# Altium integrated library Mastermind Devices.IntLib: 910 symbols (part 5 of 6) (continued)
## SS12D00G3 (continued)
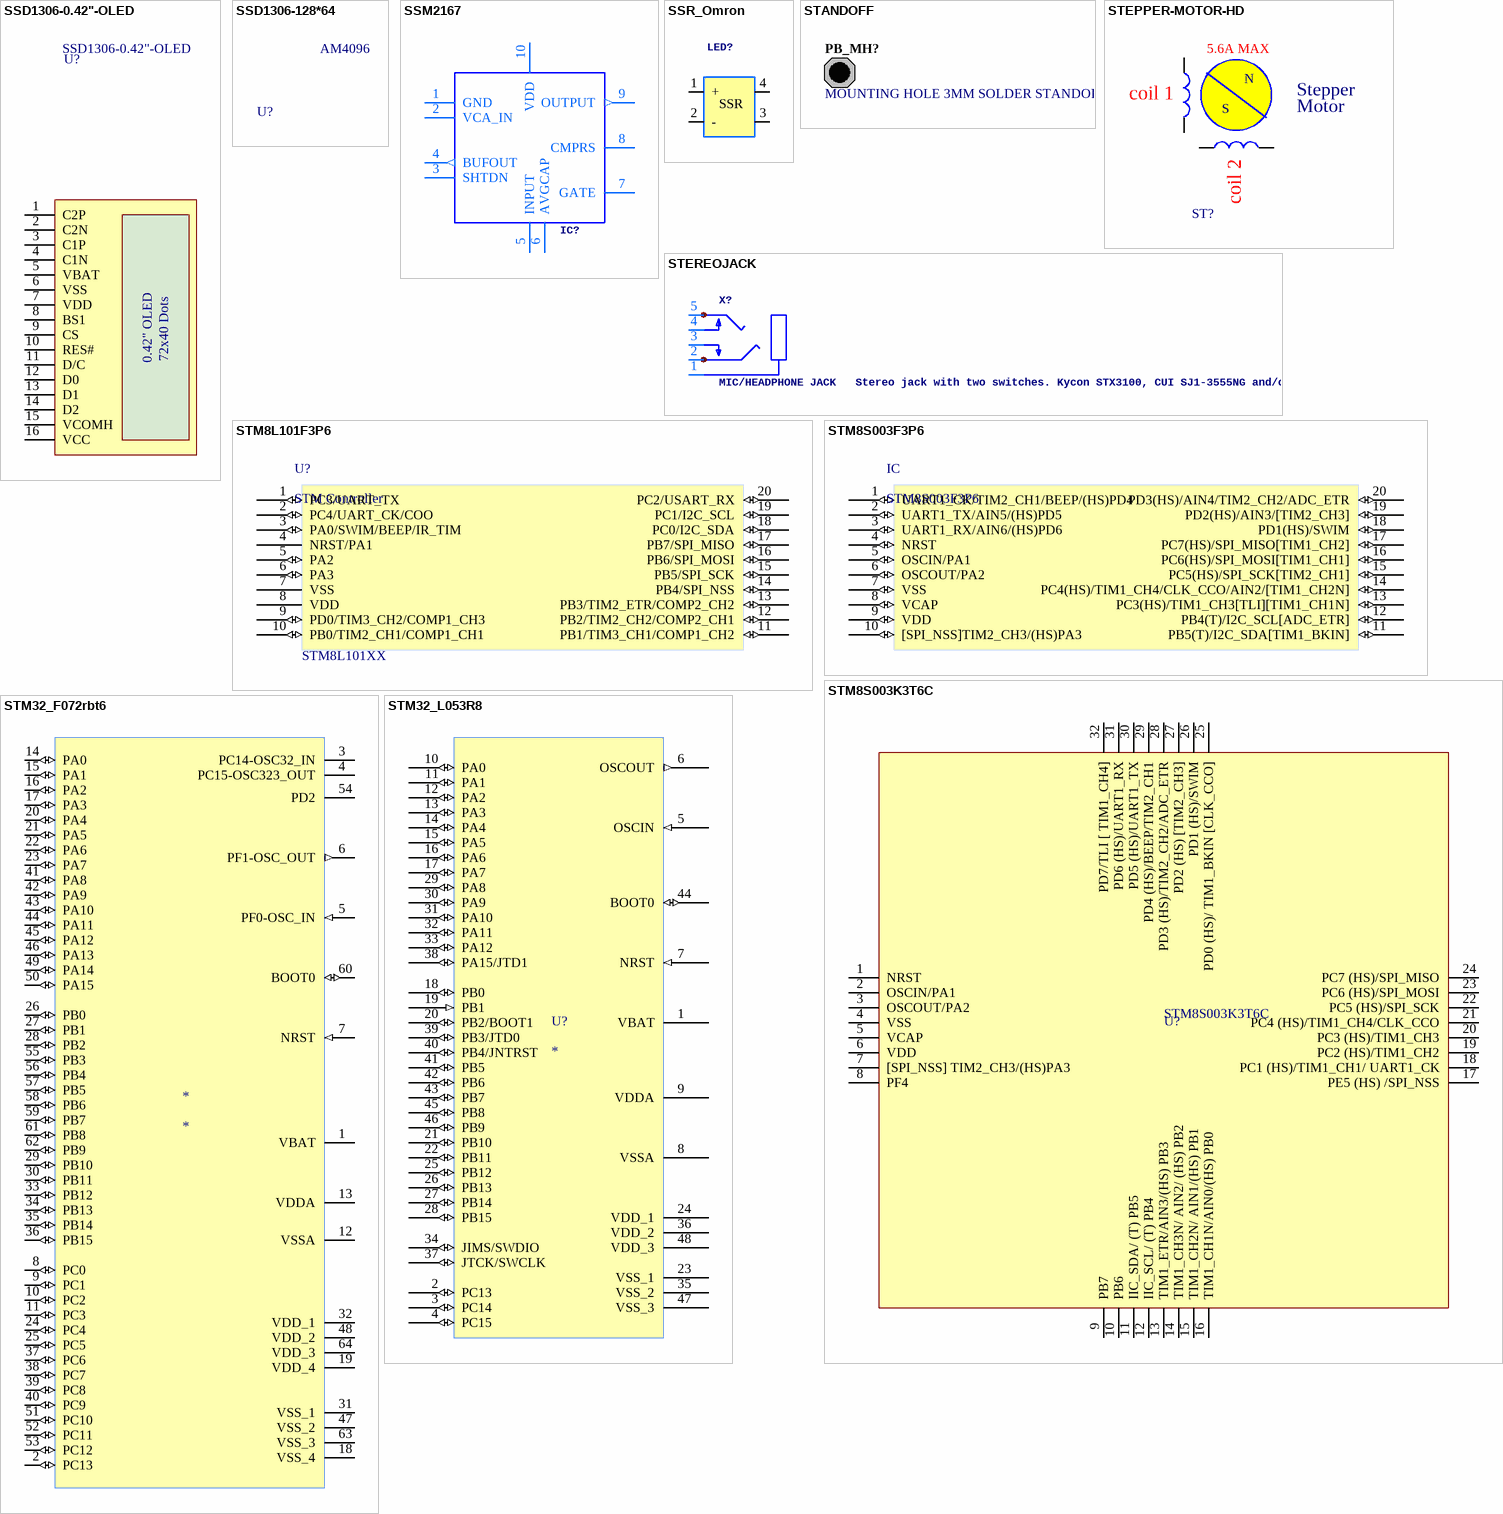
[diagram p31: symbols SSD1306-0.42"-OLED to STM32_L053R8]

## SSD1306-0.42"-OLED
designator U?
OLED Display ROHS; Manufacturer: Newvision(新智景); Symbol: N087-2832TSWYG02-H14; Add into BOM: yes; Device: N087-2832TSWYG02-H14; LCSC Part Name: 0.87寸 白光 128x32像素分辨率 14PIN; Supplier Part: C2890610; Manufacturer Part: N087-2832TSWYG02-H14; Supplier Footprint: -; JLCPCB Part Class: Extended Part; Datasheet: https://atta.szlcsc.com/upload/public/pdf/source/20220801/014279878C5155A8BB30742A627C84A8.pdf; Supplier: LCSC; Convert to PCB: yes
footprint OLED-SMD_0.42"
pins: 1 C2P, 2 C2N, 3 C1P, 4 C1N, 5 VBAT, 6 VSS, 7 VDD, 8 BS1, 9 CS, 10 RES#, 11 D/C, 12 D0, 13 D1, 14 D2, 15 VCOMH, 16 VCC
text: 0.42" OLED; 72x40 Dots

## SSD1306-128*64
designator U?, comment AM4096
OLED Display ROHS

## SSM2167
designator IC?, comment SSM2167   Microphone conditioner chip  (value not drawn)
footprint MSOP10
pins: 1 GND (power), 2 VCA_IN, 3 SHTDN, 4 BUFOUT (out), 5 INPUT, 6 AVGCAP, 7 GATE, 8 CMPRS, 9 OUTPUT (out), 10 VDD (power)

## SSR_Omron
designator LED?  (value not drawn)
footprint SSR_Omron
pins: 1 +, 2 -, 3, 4
text: SSR

## STANDOFF
designator PB_MH?, comment MOUNTING HOLE 3MM SOLDER STANDOFF  (no BOM)
Mounting Hole for Solder Standoff, M3 Screw, Plated, Round Pad; Category: Mounting-Hole; Status: Production
footprint STANDOFF_SOLDER_3MM
pins: 1 hidden

## STEPPER-MOTOR-HD
designator ST?
4PIN stepper Motor
footprint JST_B4B-XH-A(LF)(SN)
pins: 1, 2, 3, 4
text: 5.6A MAX; N; coil 1; Stepper; S; Motor; coil 2

## STEREOJACK
designator X?, comment MIC/HEADPHONE JACK   Stereo jack with two switches. Kycon STX3100, CUI SJ1-3555NG and/or 4UCon 05544
footprint STX3100
pins: 1, 2, 3, 4, 5

## STM8L101F3P6
designator U?, comment STM Controller
STM8 8-Bit 16MHz 8KB _8K x 8_ FLASH; MP: STM8S003F3P6; MF: STMicroelectronics; Availability: Unavailable; SnapEDA_Link: https://www.snapeda.com/parts/STM8S003F3P6/STMicroelectronics/view-part/47650/?ref=snap; Price: None; Value: *; Package: TSSOP-20 STMicroelectronics
footprint TSSOP20
pins: 1 PC3/UART_TX (io), 2 PC4/UART_CK/COO (io), 3 PA0/SWIM/BEEP/IR_TIM (io), 4 NRST/PA1 (oc), 5 PA2 (io), 6 PA3 (io), 7 VSS (power), 8 VDD (power), 9 PD0/TIM3_CH2/COMP1_CH3 (io), 10 PB0/TIM2_CH1/COMP1_CH1 (io), 11 PB1/TIM3_CH1/COMP1_CH2 (io), 12 PB2/TIM2_CH2/COMP2_CH1 (io), 13 PB3/TIM2_ETR/COMP2_CH2 (io), 14 PB4/SPI_NSS (io), 15 PB5/SPI_SCK (io), 16 PB6/SPI_MOSI (io), 17 PB7/SPI_MISO (io), 18 PC0/I2C_SDA (io), 19 PC1/I2C_SCL (io), 20 PC2/USART_RX (io)
text: STM8L101XX

## STM8S003F3P6
designator IC
STM8 8-Bit 16MHz 8KB _8K x 8_ FLASH; MF: STMicroelectronics; Availability: Unavailable; SnapEDA_Link: https://www.snapeda.com/parts/STM8S003F3P6/STMicroelectronics/view-part/47650/?ref=snap; MP: STM8S003F3P6; Price: None; Value: *; Package: TSSOP-20 STMicroelectronics
footprint TSSOP20
pins: 1 UART1_CK/TIM2_CH1/BEEP/(HS)PD4 (io), 2 UART1_TX/AIN5/(HS)PD5 (io), 3 UART1_RX/AIN6/(HS)PD6 (io), 4 NRST (io), 5 OSCIN/PA1 (io), 6 OSCOUT/PA2 (io), 7 VSS (io), 8 VCAP (io), 9 VDD (io), 10 [SPI_NSS]TIM2_CH3/(HS)PA3 (io), 11 PB5(T)/I2C_SDA[TIM1_BKIN] (io), 12 PB4(T)/I2C_SCL[ADC_ETR] (io), 13 PC3(HS)/TIM1_CH3[TLI][TIM1_CH1N] (io), 14 PC4(HS)/TIM1_CH4/CLK_CCO/AIN2/[TIM1_CH2N] (io), 15 PC5(HS)/SPI_SCK[TIM2_CH1] (io), 16 PC6(HS)/SPI_MOSI[TIM1_CH1] (io), 17 PC7(HS)/SPI_MISO[TIM1_CH2] (io), 18 PD1(HS)/SWIM (io), 19 PD2(HS)/AIN3/[TIM2_CH3] (io), 20 PD3(HS)/AIN4/TIM2_CH2/ADC_ETR (io)

## STM8S003K3T6C
designator U?
STM8 16MHz LQFP-32(7x7) Microcontrollers (MCU/MPU/SOC) ROHS; Manufacturer: ST(意法半导体); Add into BOM: yes; Program Storage Size: 8KB; RAM Size: 1KB; GPIO Ports Number: 28; Operating Voltage Range: 2.95V~5.5V; Program Memory Type: FLASH; ADC (Bit): 10bit; Peripheral/Function: Watchdog；PWM; Symbol: STM8S003K3T6C; Device: STM8S003K3T6C; LCSC Part Name: 主流超值系列8位MCU，具有8 KB Flash、16 MHz CPU和集成EEPROM; Supplier Part: C27142; Manufacturer Part: STM8S003K3T6C; Supplier Footprint: LQFP-32(7x7); JLCPCB Part Class: Extended Part; Datasheet: https://atta.szlcsc.com/upload/public/pdf/source/20140319/1457707024027.pdf; Supplier: LCSC; Convert to PCB: yes; CPU Core: STM8; CPU Maximum Speed: 16MHz; Operating Temperature Range: -40℃~+85℃; DAC (Bit): -; PWM (Bit): -; Universal Serial Bus: -; Internal Comparator: -; communication protocol: -; Watchdog: Yes; Real-Time Clock: -; Infrared Data Association: Yes; Low-Voltage Detect: Yes; CCP Capture/Compare: -; Secure Digital Input and Output: -; Direct Memory Access: -; Internal Oscillator: Yes
footprint LQFP-32_L7.0-W7.0-P0.80-LS9.0-BL
pins: 1 NRST, 2 OSCIN/PA1, 3 OSCOUT/PA2, 4 VSS, 5 VCAP, 6 VDD, 7 [SPI_NSS] TIM2_CH3/(HS)PA3, 8 PF4, 9 PB7, 10 PB6, 11 IIC_SDA/ (T) PB5, 12 IIC_SCL/ (T) PB4, 13 TIM1_ETR/AIN3/(HS) PB3, 14 TIM1_CH3N/ AIN2/ (HS) PB2, 15 TIM1_CH2N/ AIN1/(HS) PB1, 16 TIM1_CH1N/AIN0/(HS) PB0, 17 PE5 (HS) /SPI_NSS, 18 PC1 (HS)/TIM1_CH1/ UART1_CK, 19 PC2 (HS)/TIM1_CH2, 20 PC3 (HS)/TIM1_CH3, 21 PC4 (HS)/TIM1_CH4/CLK_CCO, 22 PC5 (HS)/SPI_SCK, 23 PC6 (HS)/SPI_MOSI, 24 PC7 (HS)/SPI_MISO, 25 PD0 (HS)/ TIM1_BKIN [CLK_CCO], 26 PD1 (HS)/SWIM, 27 PD2 (HS) [TIM2_CH3], 28 PD3 (HS)/TIM2_CH2/ADC_ETR, 29 PD4 (HS)/BEEP/TIM2_CH1, 30 PD5 (HS)/UART1_TX, 31 PD6 (HS)/UART1_RX, 32 PD7/TLI [ TIM1_CH4]

## STM32_F072rbt6
designator *
footprint TQFP64
pins: 1 VBAT, 2 PC13 (io), 3 PC14-OSC32_IN, 4 PC15-OSC323_OUT, 5 PF0-OSC_IN (in), 6 PF1-OSC_OUT (out), 7 NRST (in), 8 PC0 (io), 9 PC1 (io), 10 PC2 (io), 11 PC3 (io), 12 VSSA, 13 VDDA, 14 PA0 (io), 15 PA1 (io), 16 PA2 (io), 17 PA3 (io), 18 VSS_4, 19 VDD_4, 20 PA4 (io), 21 PA5 (io), 22 PA6 (io), 23 PA7 (io), 24 PC4 (io), 25 PC5 (io), 26 PB0 (io), 27 PB1 (io), 28 PB2 (io), 29 PB10 (io), 30 PB11 (io), 31 VSS_1, 32 VDD_1, 33 PB12 (io), 34 PB13 (io), 35 PB14 (io), 36 PB15 (io), 37 PC6 (io), 38 PC7 (io), 39 PC8 (io), 40 PC9 (io), 41 PA8 (io), 42 PA9 (io), 43 PA10 (io), 44 PA11 (io), 45 PA12 (io), 46 PA13 (io), 47 VSS_2, 48 VDD_2, 49 PA14 (io), 50 PA15 (io), 51 PC10 (io), 52 PC11 (io), 53 PC12 (io), 54 PD2, 55 PB3 (io), 56 PB4 (io), 57 PB5 (io), 58 PB6 (io), 59 PB7 (io), 60 BOOT0 (io), 61 PB8 (io), 62 PB9 (io), 63 VSS_3, 64 VDD_3

## STM32_L053R8
designator U?
48 pin STM32
footprint TQFP48
pins: 1 VBAT, 2 PC13 (io), 3 PC14 (io), 4 PC15 (io), 5 OSCIN (in), 6 OSCOUT (out), 7 NRST (in), 8 VSSA, 9 VDDA, 10 PA0 (io), 11 PA1 (io), 12 PA2 (io), 13 PA3 (io), 14 PA4 (io), 15 PA5 (io), 16 PA6 (io), 17 PA7 (io), 18 PB0 (io), 19 PB1 (in), 20 PB2/BOOT1 (io), 21 PB10 (io), 22 PB11 (io), 23 VSS_1, 24 VDD_1, 25 PB12 (io), 26 PB13 (io), 27 PB14 (io), 28 PB15 (io), 29 PA8 (io), 30 PA9 (io), 31 PA10 (io), 32 PA11 (io), 33 PA12 (io), 34 JIMS/SWDIO (io), 35 VSS_2, 36 VDD_2, 37 JTCK/SWCLK (io), 38 PA15/JTD1 (io), 39 PB3/JTD0 (io), 40 PB4/JNTRST (io), 41 PB5 (io), 42 PB6 (io), 43 PB7 (io), 44 BOOT0 (io), 45 PB8 (io), 46 PB9 (io), 47 VSS_3, 48 VDD_3

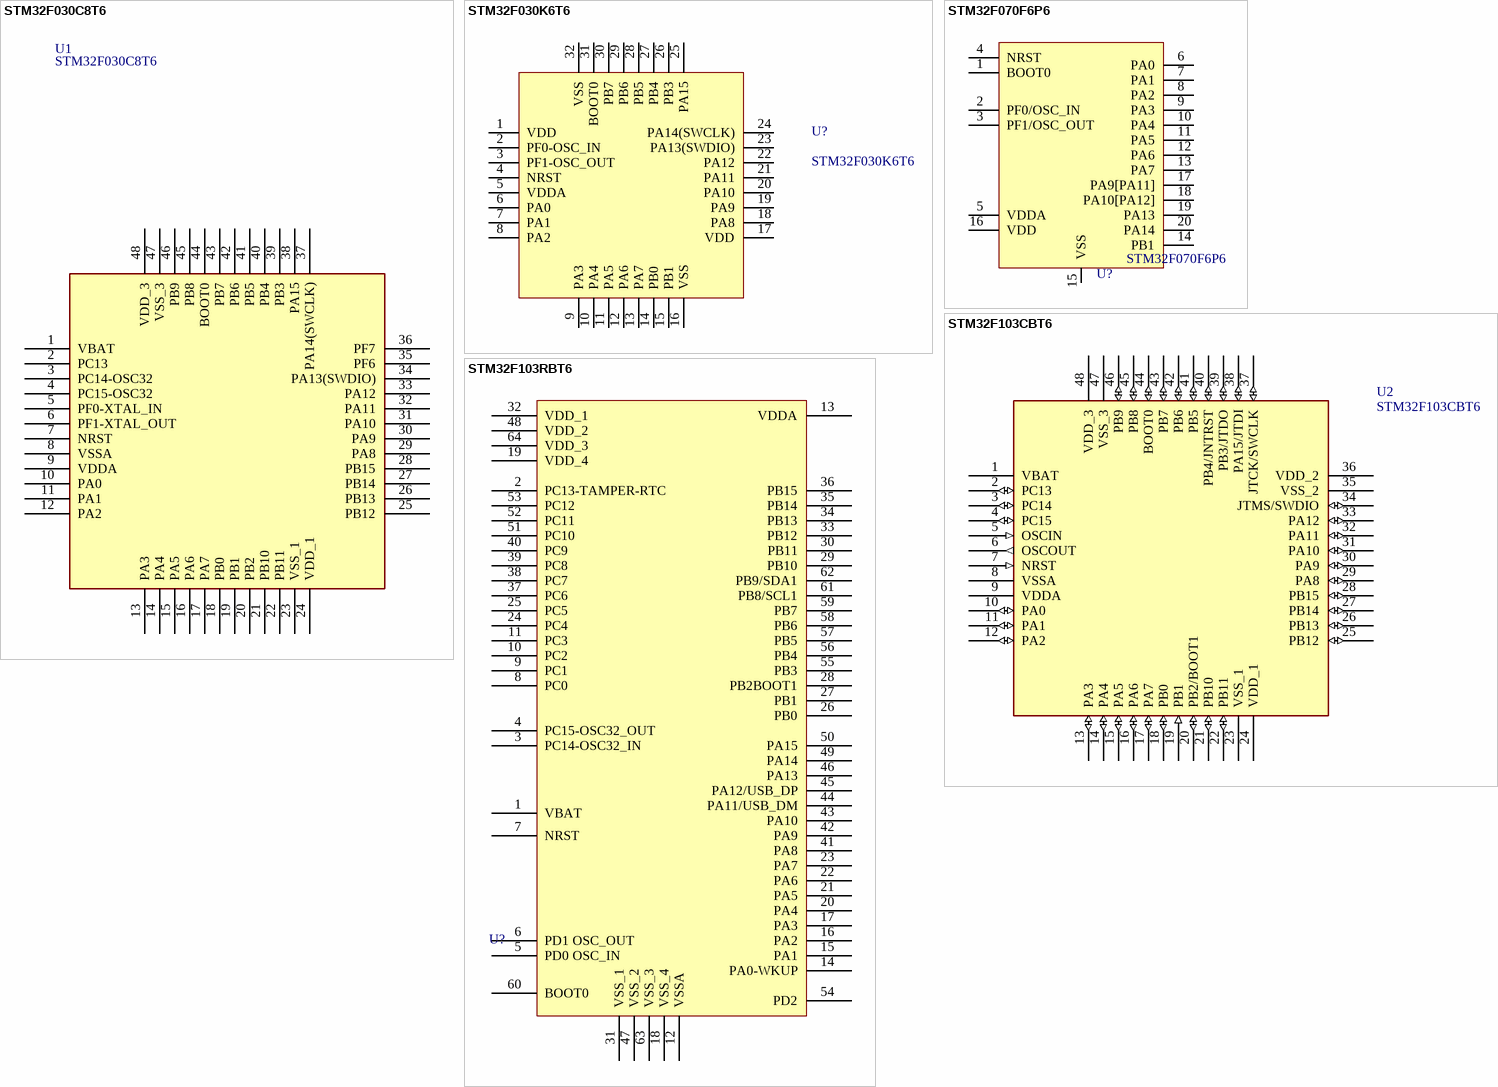
[diagram p32: symbols STM32F030C8T6 to STM32F103RBT6]

## STM32F030C8T6
designator U1
subpart_no: 1; Manufacturer: ST(意法半导体); tags: STM32; image: http://image.lceda.cn/szlcsc/C23922.jpg; Supplier Part: C23922; Supplier: LCSC; Manufacturer Part: STM32F030C8T6; JLCPCB Part Class: Extended Part; spicePre: U; spiceSymbolName: STM32F030C8T6
footprint LQFP-48_L7.0-W7.0-P0.50-LS9.0-BL
footprint QFP48 7X7
pins: 1 VBAT (power), 2 PC13, 3 PC14-OSC32, 4 PC15-OSC32, 5 PF0-XTAL_IN, 6 PF1-XTAL_OUT, 7 NRST, 8 VSSA (power), 9 VDDA (power), 10 PA0, 11 PA1, 12 PA2, 13 PA3, 14 PA4, 15 PA5, 16 PA6, 17 PA7, 18 PB0, 19 PB1, 20 PB2, 21 PB10, 22 PB11, 23 VSS_1 (power), 24 VDD_1 (power), 25 PB12, 26 PB13, 27 PB14, 28 PB15, 29 PA8, 30 PA9, 31 PA10, 32 PA11, 33 PA12, 34 PA13(SWDIO), 35 PF6, 36 PF7, 37 PA14(SWCLK), 38 PA15, 39 PB3, 40 PB4, 41 PB5, 42 PB6, 43 PB7, 44 BOOT0, 45 PB8, 46 PB9, 47 VSS_3 (power), 48 VDD_3 (power)

## STM32F030K6T6
designator U?
ARM-M0 48MHz LQFP-32(7x7) Microcontrollers (MCU/MPU/SOC) ROHS; Manufacturer: ST(意法半导体); Add into BOM: yes; Program Storage Size: 32KB; Program Memory Type: FLASH; Number of I/O: 26; ADC (Bit): 12bit; Low Voltage Detection Threshold: 2.4V~3.6V; Symbol: STM32F030K6T6; Device: STM32F030K6T6; LCSC Part Name: 主流ARM Cortex-M0超值系列MCU，具有32 KB Flash和48 MHz CPU; Supplier Part: C46830; Manufacturer Part: STM32F030K6T6; Supplier Footprint: LQFP-32(7x7); JLCPCB Part Class: Extended Part; Datasheet: https://atta.szlcsc.com/upload/public/pdf/source/20161209/1481271865294.pdf; Supplier: LCSC; Convert to PCB: yes; CPU Core: ARM-M0; CPU Maximum Speed: 48MHz; Application Area: -
footprint TQFP-32_L7.0-W7.0-P0.50-BL
3D model TQFP-32_L7.0-W7.0-H1.2-LS9.0-P0.80
pins: 1 VDD, 2 PF0-OSC_IN, 3 PF1-OSC_OUT, 4 NRST, 5 VDDA, 6 PA0, 7 PA1, 8 PA2, 9 PA3, 10 PA4, 11 PA5, 12 PA6, 13 PA7, 14 PB0, 15 PB1, 16 VSS, 17 VDD, 18 PA8, 19 PA9, 20 PA10, 21 PA11, 22 PA12, 23 PA13(SWDIO), 24 PA14(SWCLK), 25 PA15, 26 PB3, 27 PB4, 28 PB5, 29 PB6, 30 PB7, 31 BOOT0, 32 VSS

## STM32F070F6P6
designator U?
ARM-M0 48MHz TSSOP-20 Microcontrollers (MCU/MPU/SOC) ROHS; Manufacturer: ST(意法半导体); Add into BOM: yes; Program Storage Size: 32KB; Program Memory Type: FLASH; Number of I/O: 15; ADC (Bit): 12bit; Low Voltage Detection Threshold: 2.4V~3.6V; Symbol: STM32F070F6P6; LCSC Part Name: 主流ARM Cortex-M0超值系列MCU，具有至多32 KB Flash、48 MHz CPU和USB功能; Supplier Part: C86951; Manufacturer Part: STM32F070F6P6; Supplier Footprint: TSSOP-20; JLCPCB Part Class: Extended Part; Datasheet: https://atta.szlcsc.com/upload/public/pdf/source/20170105/1483608757662.pdf; Supplier: LCSC; Convert to PCB: yes; CPU Core: ARM-M0; CPU Maximum Speed: 48MHz; Application Area: -; Device: STM32F070F6P6
footprint TSSOP-20_L6.5-W4.4-P0.65-LS6.4-BL
3D model TSSOP-20_L6.5-W4.4-H1.0-LS6.4-P0.65
pins: 1 BOOT0, 2 PF0/OSC_IN, 3 PF1/OSC_OUT, 4 NRST, 5 VDDA, 6 PA0, 7 PA1, 8 PA2, 9 PA3, 10 PA4, 11 PA5, 12 PA6, 13 PA7, 14 PB1, 15 VSS, 16 VDD, 17 PA9[PA11], 18 PA10[PA12], 19 PA13, 20 PA14

## STM32F103CBT6
designator U2
Medium-density performance line ARM-based 32-bit MCU with 64KB Flash; Manuf_Part_1: STM32F103C8T6; Manuf_1: STM; Ref St: 9175981; Provided: ST; ECCN_US/EU: 3A991A2/NEC; Footprint: QFP48 7X7; Distrib: ST; Order: STM32F103C8T6
footprint QFP48 7X7
pins: 1 VBAT (power), 2 PC13 (io), 3 PC14 (io), 4 PC15 (io), 5 OSCIN (in), 6 OSCOUT (out), 7 NRST (in), 8 VSSA (power), 9 VDDA (power), 10 PA0 (io), 11 PA1 (io), 12 PA2 (io), 13 PA3 (io), 14 PA4 (io), 15 PA5 (io), 16 PA6 (io), 17 PA7 (io), 18 PB0 (io), 19 PB1 (in), 20 PB2/BOOT1 (io), 21 PB10 (io), 22 PB11 (io), 23 VSS_1 (power), 24 VDD_1 (power), 25 PB12 (io), 26 PB13 (io), 27 PB14 (io), 28 PB15 (io), 29 PA8 (io), 30 PA9 (io), 31 PA10 (io), 32 PA11 (io), 33 PA12 (io), 34 JTMS/SWDIO (io), 35 VSS_2 (power), 36 VDD_2 (power), 37 JTCK/SWCLK (io), 38 PA15/JTDI (io), 39 PB3/JTDO (io), 40 PB4/JNTRST (io), 41 PB5 (io), 42 PB6 (io), 43 PB7 (io), 44 BOOT0 (io), 45 PB8 (io), 46 PB9 (io), 47 VSS_3 (power), 48 VDD_3 (power)

## STM32F103RBT6
designator U?  (value not drawn)
Manufacturer: ST(意法半导体); Supplier: LCSC; Manufacturer Part: STM32F103RBT6; Supplier Part: C8735; JLCPCB Part Class: Extended Part; link: https://lcsc.com/eda_search?q=C8735&%26type=1&ref=editor; spicePre: U; spiceSymbolName: STM32F103RBT6
footprint LQFP-64_L10.0-W10.0-P0.50-LS12.0-BL
pins: 1 VBAT, 2 PC13-TAMPER-RTC, 3 PC14-OSC32_IN, 4 PC15-OSC32_OUT, 5 PD0 OSC_IN, 6 PD1 OSC_OUT, 7 NRST, 8 PC0, 9 PC1, 10 PC2, 11 PC3, 12 VSSA, 13 VDDA, 14 PA0-WKUP, 15 PA1, 16 PA2, 17 PA3, 18 VSS_4, 19 VDD_4, 20 PA4, 21 PA5, 22 PA6, 23 PA7, 24 PC4, 25 PC5, 26 PB0, 27 PB1, 28 PB2BOOT1, 29 PB10, 30 PB11, 31 VSS_1, 32 VDD_1, 33 PB12, 34 PB13, 35 PB14, 36 PB15, 37 PC6, 38 PC7, 39 PC8, 40 PC9, 41 PA8, 42 PA9, 43 PA10, 44 PA11/USB_DM, 45 PA12/USB_DP, 46 PA13, 47 VSS_2, 48 VDD_2, 49 PA14, 50 PA15, 51 PC10, 52 PC11, 53 PC12, 54 PD2, 55 PB3, 56 PB4, 57 PB5, 58 PB6, 59 PB7, 60 BOOT0, 61 PB8/SCL1, 62 PB9/SDA1, 63 VSS_3, 64 VDD_3

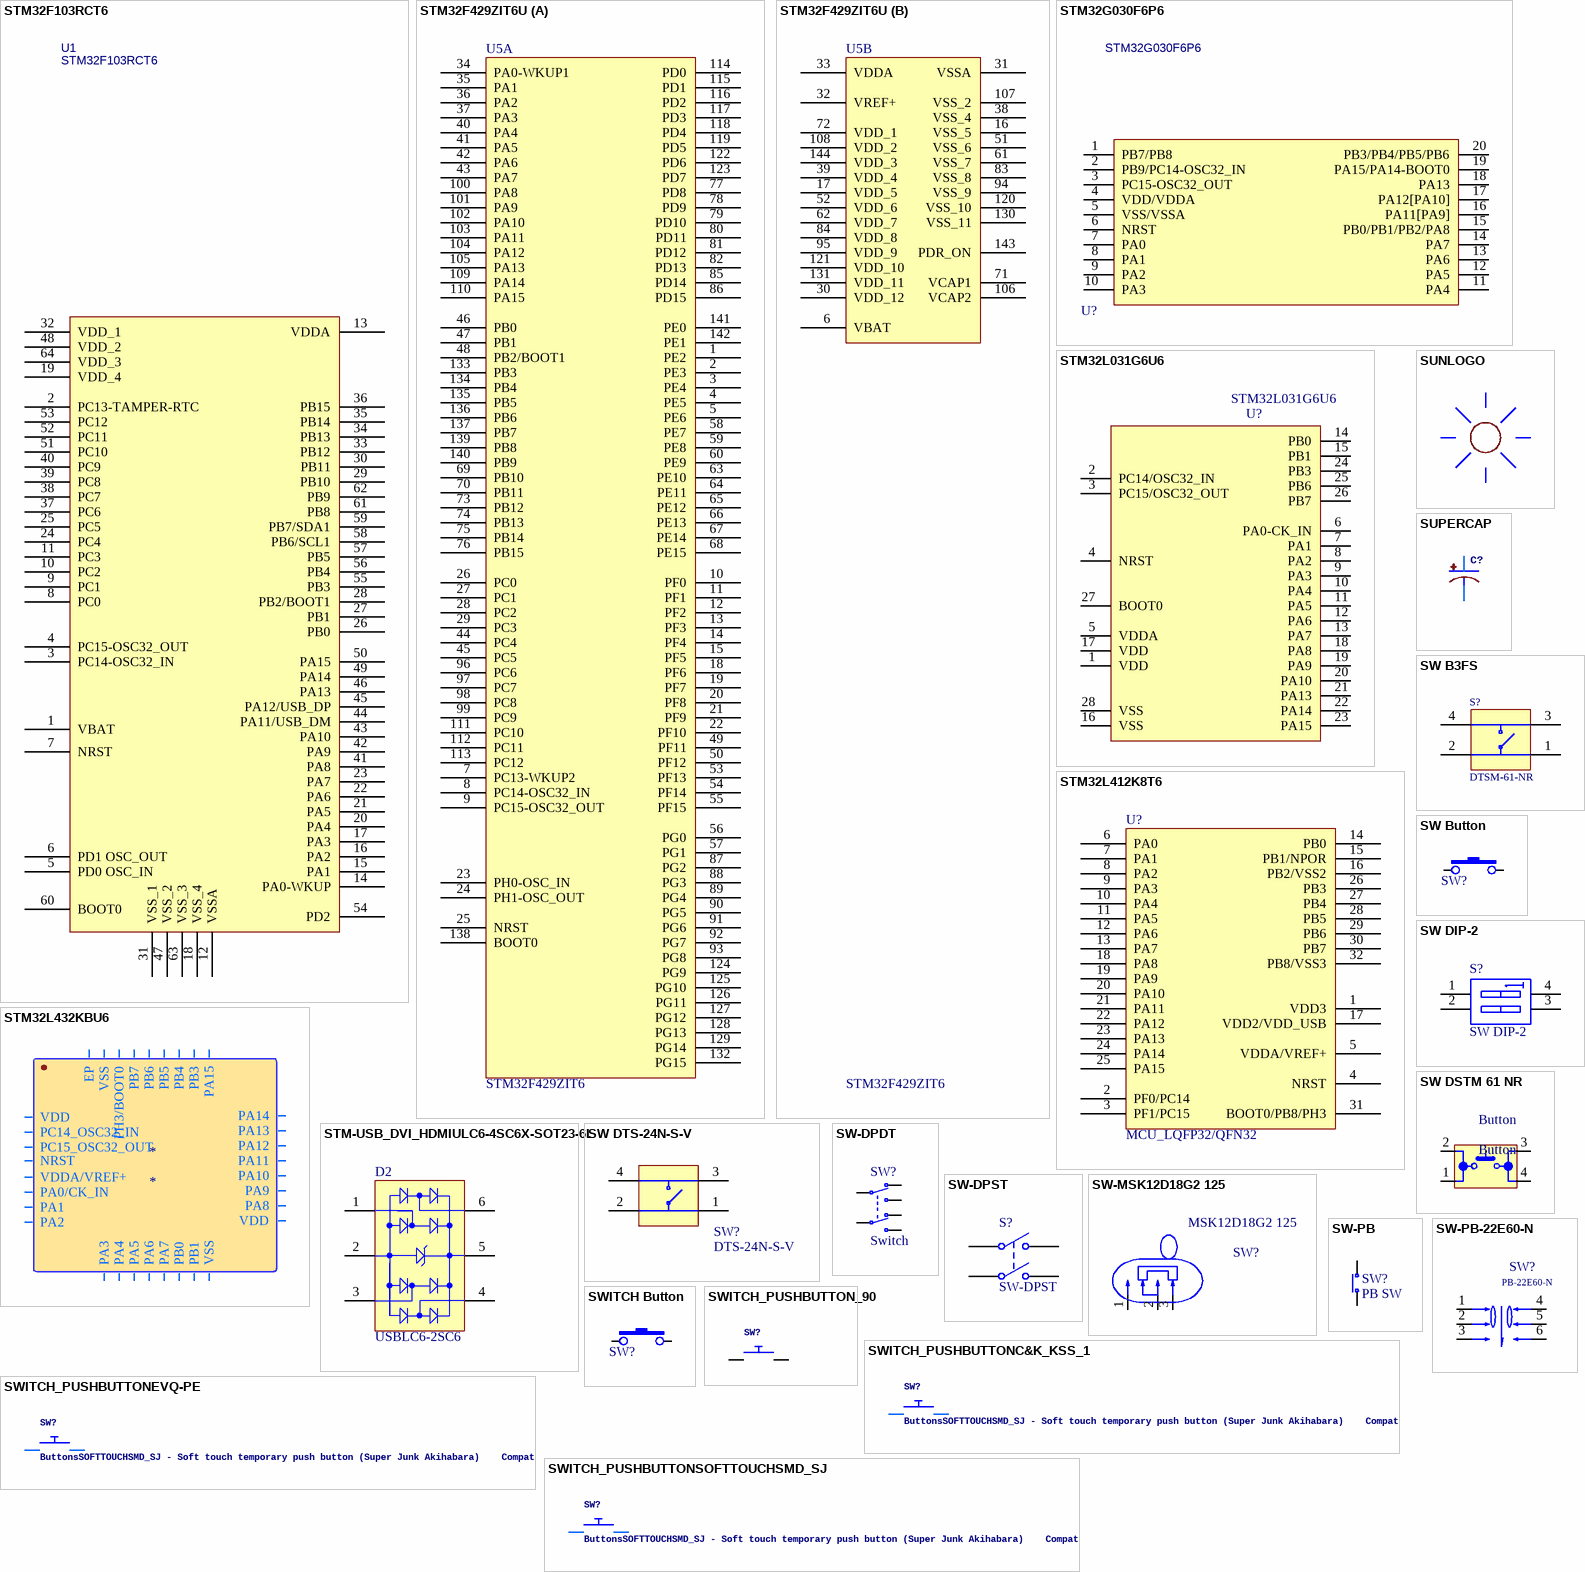
[diagram p33: symbols STM32F103RCT6 to SWITCH_PUSHBUTTONSOFTTOUCHSMD_SJ]

## STM32F103RCT6
designator U1
Manufacturer: ST(意法半导体); Supplier: LCSC; Manufacturer Part: STM32F103RCT6; Supplier Part: C8323; JLCPCB Part Class: Extended Part; spicePre: U; spiceSymbolName: STM32F103RCT6
footprint LQFP-64_L10.0-W10.0-P0.50-LS12.0-BL
pins: 1 VBAT, 2 PC13-TAMPER-RTC, 3 PC14-OSC32_IN, 4 PC15-OSC32_OUT, 5 PD0 OSC_IN, 6 PD1 OSC_OUT, 7 NRST, 8 PC0, 9 PC1, 10 PC2, 11 PC3, 12 VSSA, 13 VDDA, 14 PA0-WKUP, 15 PA1, 16 PA2, 17 PA3, 18 VSS_4, 19 VDD_4, 20 PA4, 21 PA5, 22 PA6, 23 PA7, 24 PC4, 25 PC5, 26 PB0, 27 PB1, 28 PB2/BOOT1, 29 PB10, 30 PB11, 31 VSS_1, 32 VDD_1, 33 PB12, 34 PB13, 35 PB14, 36 PB15, 37 PC6, 38 PC7, 39 PC8, 40 PC9, 41 PA8, 42 PA9, 43 PA10, 44 PA11/USB_DM, 45 PA12/USB_DP, 46 PA13, 47 VSS_2, 48 VDD_2, 49 PA14, 50 PA15, 51 PC10, 52 PC11, 53 PC12, 54 PD2, 55 PB3, 56 PB4, 57 PB5, 58 PB6/SCL1, 59 PB7/SDA1, 60 BOOT0, 61 PB8, 62 PB9, 63 VSS_3, 64 VDD_3
